# Altium integrated library Telephone.IntLib: 113 symbols (continued)
## CMP-002-00163-4 (continued)

## CMP-002-00176-3
designator P?, comment 170204-2  (mechanical)
170204-2 TE Connectivity Connector Contacts SKT Crimp ST Cable Mount 20-26AWG Loose - Arrow.com; Connector Type: Socket; Gender: Female; Insulation Resistance: 500MR; PCB Mount Retention: Without; Contact Current Rating: 2A; Number of Contacts: 6; Shielding: Unshielded; Voltage Rating (AC): 600V; Wire/Cable Gauge: 26AWG; Wire Gauge (Min): 20AWG; Pitch: 2.54mm; Insulation Diameter: 1.91mm; Plating Thickness: 0.8um; Voltage Rating: 250V; Manufacturer: TE Connectivity; Manufacturer Part Number: 170204-2; RoHS: Yes; Category: Connectors; Stock 1: 90196; Pricing 1: 1=0.12, 10=0.088, 50=0.088, 100=0.074, 1000=0.065, 10000=0.065 (USD); Mount: Cable,Through Hole; Contact Material: Bronze; Contact Plating: Tin; Housing Color: White; Housing Material: Nylon; Min Operating Temperature: -20°C; Max Operating Temperature: 105°C; Series: EI; Packaging: Loose Piece; Termination: Crimp; Contact Gender: Female; Orientation: Straight; Contact Type: Signal; Number of Rows: 1; Length: 11.1mm; Height: 10.79mm; Wire Gauge (Max): 26AWG; Depth: 2.36mm; RoHS Compliant: Yes; Reach SVHC Compliant: No; Lead Free: Lead Free; ELV: Compliant; ComponentLink1URL: https://datasheet.ciiva.com/16313/170204-2-16313345.pdf?src-supplier=Future+Electronics; ComponentLink1Description: https://datasheet.ciiva.com/16313/170204-2-16313345.pdf?src-supplier=Future+Electronics; ComponentLink2URL: https://datasheet.ciiva.com/19462/1962957-19462033.pdf?src-supplier=Jameco; ComponentLink2Description: https://datasheet.ciiva.com/19462/1962957-19462033.pdf?src-supplier=Jameco; ComponentLink3URL: https://datasheet.ciiva.com/22685/1688153-22685777.pdf?src-supplier=Element14; ComponentLink3Description: https://datasheet.ciiva.com/22685/1688153-22685777.pdf?src-supplier=Element14; ComponentLink4URL: https://datasheet.ciiva.com/18487/jpn-ss-114-5035-h-18487847.pdf?src-supplier=Digi-Key; ComponentLink4Description: https://datasheet.ciiva.com/18487/jpn-ss-114-5035-h-18487847.pdf?src-supplier=Digi-Key; ComponentLink5URL: https://datasheet.ciiva.com/15175/getdatasheetpartid-32247-15175269.pdf?src-supplier=Verical; ComponentLink5Description: https://datasheet.ciiva.com/15175/getdatasheetpartid-32247-15175269.pdf?src-supplier=Verical; ComponentLink6URL: https://datasheet.ciiva.com/11723/0900766b80d9a1b2-11723424.pdf?src-supplier=Rs; ComponentLink6Description: https://datasheet.ciiva.com/11723/0900766b80d9a1b2-11723424.pdf?src-supplier=Rs; ComponentLink7URL: https://datasheet.ciiva.com/30100/basics0-171822-2-0-30100471.pdf?src-supplier=Onlinecomponents.com; ComponentLink7Description: https://datasheet.ciiva.com/30100/basics0-171822-2-0-30100471.pdf?src-supplier=Onlinecomponents.com; ComponentLink8URL: https://datasheet.ciiva.com/16934/70085978-16934021.pdf?src-supplier=Allied+Electronics; ComponentLink8Description: https://datasheet.ciiva.com/16934/70085978-16934021.pdf?src-supplier=Allied+Electronics; ComponentLink9URL: https://datasheet.ciiva.com/696/jpn-ss-114-5035-h-696652.pdf?src-supplier=Digi-Key; ComponentLink9Description: https://datasheet.ciiva.com/696/jpn-ss-114-5035-h-696652.pdf?src-supplier=Digi-Key; Case/Package: 1000; Pins: 0; Design Item ID: 170204-2; Component Type: Mechanical; Source: V4-TEL.SCHLIB; Mounting Technology: Cable,Through Hole; Max Voltage Rating (AC): 250V; Package Quantity: 1000; Component Type: Connectors

## CMP-002-00177-2
designator P?, comment 66200421122  (value not drawn)
WR-MPC3 Series; 3mm Pitch 4 Way 2 Row Shrouded Straight PCB Header; Through Hole; Manufacturer: Wurth Electronics; Current Rating: 5A; Voltage Rating: 250V; Number of Positions: 4; Insulation: Insulated; Insulation Resistance: 1GR; Gender: Receptacle; Row Spacing: 0.118inch; Manufacturer Part Number: 66200421122; Category: Headers and Wire Housings; Mounting Technology: Through Hole; Color: Black; Contact Material: Copper Alloy,Copper; Contact Plating: Tin; Housing Material: Nylon; Contact Shape: Square; Contact Finish - Mating: TIN; Insulation Material: Polymer; Insulation Color: Black; Min Operating Temperature: -25°C; Max Operating Temperature: 105°C; Number of Rows: 2; Fastening Type: Ramp; Packaging: Tray; Contact Gender: Male; Termination: Through Hole; Number of Contacts: 4; Connector Type: Header; Series: WR-MPC3; Contact Type: Male Pin; Length: 9.7mm; Width: 9.7mm; Height: 9.9mm; Pitch: 3mm; Flammability Rating: UL94 V-0; RoHS Compliant: Yes; Reach SVHC Compliant: Unknown; ComponentLink1URL: https://datasheet.ciiva.com/8043/624425-8043413.pdf?src-supplier=Element14; ComponentLink1Description: https://datasheet.ciiva.com/8043/624425-8043413.pdf?src-supplier=Element14; ComponentLink2URL: https://datasheet.ciiva.com/731/6620xx21122-731329.pdf?src-supplier=Digi-Key; ComponentLink2Description: https://datasheet.ciiva.com/731/6620xx21122-731329.pdf?src-supplier=Digi-Key; Case/Package: 63; Pins: 4; Design Item ID: 66200421122; Component Type: Standard; Component Type: Connectors
footprint power-4pin
pins: 1, 2, 3, 4

## CMP-002-00178-2
designator P?, comment 66201021122  (value not drawn)
WR-MPC3; 3mm Pitch 10 Way 2 Row Shrouded Straight PCB Header; Through Hole; Manufacturer: Wurth Electronics; Current Rating: 5A; Voltage Rating: 250V; Number of Positions: 10; Insulation: Insulated; Insulation Resistance: 1GR; Gender: Receptacle; Manufacturer Part Number: 66201021122; Category: Headers and Wire Housings; Mounting Technology: Through Hole; Color: Black; Contact Material: Copper Alloy,Copper; Contact Plating: Tin; Housing Material: Nylon; Contact Shape: Square; Contact Finish - Mating: TIN; Insulation Material: Polymer; Insulation Color: Black; Min Operating Temperature: -25°C; Max Operating Temperature: 105°C; Number of Rows: 2; Fastening Type: Ramp; Packaging: Tray; Contact Gender: Male; Termination: Through Hole; Number of Contacts: 10; Connector Type: Header; Series: WR-MPC3; Contact Type: Male Pin; Length: 18.7mm; Width: 18.7mm; Height: 9.9mm; Pitch: 3mm; Flammability Rating: UL94 V-0; RoHS Compliant: Yes; Reach SVHC Compliant: Unknown; ComponentLink1URL: https://datasheet.ciiva.com/8043/624425-8043421.pdf?src-supplier=Element14; ComponentLink1Description: https://datasheet.ciiva.com/8043/624425-8043421.pdf?src-supplier=Element14; ComponentLink2URL: https://datasheet.ciiva.com/731/6620xx21122-731332.pdf?src-supplier=Digi-Key; ComponentLink2Description: https://datasheet.ciiva.com/731/6620xx21122-731332.pdf?src-supplier=Digi-Key; Pins: 10; Component Type: Standard; Component Type: Connectors
footprint POWER 10 PIN
pins: 1, 2, 3, 4, 5, 6, 7, 8, 9, 10

## CMP-002-00180-2
designator J?, comment 5-146274-3  (value not drawn)
Conn Unshrouded Header HDR 3 POS 2.54mm Solder ST Top Entry Thru-Hole Carton; Manufacturer: TE Connectivity; Centerline_Pitch: 2.54 mm[.1 in]; Product_Type: Connector; Connector Type: Plug,Header,Pin; Gender: Male; Voltage Rating: 750V; Approvals: CSA; Board Standoff: Yes (With); Contact Current Rating: 3A; Contact Post Length: 0.125inch; Contact Protection: No (Without); High Speed Serial Data Connector: No; High Temperature Housing: Yes; Max Voltage Rating (AC): 250V; Number of Contacts: 3; PCB Mount Retention: Without; PCB Mounting Orientation: Vertical; PCB Thickness: 0.062inch; Case/Package: None; Pins: 3; Design Item ID: 5-146274-3; EU_RoHS_Compliance: Compliant; Manufacturer Part Number: 5-146274-3; Price: None; SnapEDA_Link: https://www.snapeda.com/parts/5-146274-3/TE%20Connectivity%20AMP%20Connectors/view-part/904860/?ref=snap; Source: SnapEDAsch.SchLib; TE_purchase_URL: https://www.te.com/usa-en/product-5-146274-3.html?te_bu=Cor&te_type=disp&te_campaign=seda_glo_cor-seda-global-disp-prtnr-fy19-seda-model-bom-cta_sma-317_1&elqCampaignId=32493; Value: *; Max Operating Temperature: 105°C; Min Operating Temperature: -65°C; Mounting Technology: Through Hole; RoHS Compliant: Yes; Color: Black; Contact Finish - Mating: TIN; Contact Gender: Male; Contact Material: Bronze; Contact Mating Length: 8.08mm; Contact Plating: Tin; Contact Shape: Square; Contact Type: Male Pin; Current Rating: 3A; Depth: 2.34mm; ELV: Compliant; Fastening Type: Pull; Flammability Rating: UL94 V-0; Gasket: No (Without); Housing Color: Black; Housing Material: Polymer; Insulation Color: Black; Insulation Material: Polymer; Keyed: No; Lead Free: Lead Free; Length: 7.21mm; Mating Alignment: No (Without); Mating Connector Lock: No (Without); Number of Positions: 3; Number of Rows: 1; Orientation: Straight; Package Quantity: 540; Packaging: Carton; Pitch: 2.54mm; Radiation Hardening: No; Reach SVHC Compliant: Unknown; Row Spacing: 2.54mm; Selectively Loaded: No (Without); Series: AMPMODU MOD II; Stabilizers: No (Without); Strain Relief: No (Without); Termination: Through Hole; Component Type: Connectors
footprint TE_5-146274-3
pins: 1, 2, 3

## CMP-002-00181-1
designator J?, comment 5-146274-2
Conn Unshrouded Header HDR 2 POS 2.54mm Solder ST Top Entry Thru-Hole Carton; Manufacturer: TE Connectivity; Connector Type: Plug,Header,Pin; Gender: Male; Voltage Rating: 750V; Approvals: CSA; Board Standoff: Yes (With); Contact Current Rating: 3A; Contact Post Length: 0.125inch; Contact Protection: No (Without); High Speed Serial Data Connector: No; High Temperature Housing: Yes; Max Voltage Rating (AC): 250V; Number of Contacts: 2; PCB Mount Retention: Without; PCB Mounting Orientation: Vertical; PCB Thickness: 0.062inch; Max Operating Temperature: 105°C; Min Operating Temperature: -65°C; Mounting Technology: Through Hole; RoHS Compliant: Yes; Color: Black; Contact Finish - Mating: TIN; Contact Gender: Male; Contact Material: Bronze; Contact Mating Length: 8.08mm; Contact Plating: Tin; Contact Shape: Square; Contact Type: Male Pin; Current Rating: 3A; Depth: 2.34mm; ELV: Compliant; Fastening Type: Pull; Flammability Rating: UL94 V-0; Gasket: No (Without); Housing Color: Black; Housing Material: Polymer; Insulation Color: Black; Insulation Material: Polymer; Keyed: No; Lead Free: Lead Free; Length: 2.67mm; Mating Alignment: No (Without); Mating Connector Lock: No (Without); Number of Positions: 2; Number of Rows: 1; Orientation: Straight; Package Quantity: 500; Packaging: Carton; Pitch: 2.54mm; Radiation Hardening: No; Reach SVHC Compliant: Unknown; Row Spacing: 2.54mm; Selectively Loaded: No (Without); Series: AMPMODU MOD II; Stabilizers: No (Without); Strain Relief: No (Without); Termination: Through Hole; Manufacturer Part Number: 5-146274-2; Component Type: Connectors
footprint TE_5-146274-2
pins: 1, 2

## CMP-002-00182-1
designator J?, comment 146443-5  (value not drawn)
Conn Unshrouded Header HDR 10 POS 2.54mm Solder ST Thru-Hole Carton; Manufacturer: TE Connectivity AMP; Connector Type: Plug,Header,Pin; Board Standoff: No (Without); High Speed Serial Data Connector: No; Number of Contacts: 10; PCB Mount Retention: Without; PCB Mounting Orientation: Vertical; Plating Thickness: 5um; Mounting Technology: Surface Mount; RoHS Compliant: No; Contact Finish - Mating: GOLD; Contact Material: Copper Alloy; Contact Mating Length: 0.23inch; Contact Plating: Gold; Contact Protection: No (Without); Contact Shape: Square; Contact Type: Male Pin; ELV: Non-Compliant; Fastening Type: Pull; Gasket: No (Without); High Temperature Compatible: No; High Temperature Housing: No; Housing Color: Black; Housing Material: Thermoplastic; Keyed: No; Mating Alignment: No (Without); Mating Connector Lock: No (Without); Number of Positions: 10; Number of Rows: 2; Orientation: Vertical; Package Quantity: 320; Packaging: Carton; Pitch: 2.54mm; Radiation Hardening: No; Row Spacing: 2.54mm; Sealable: No (Without); Selectively Loaded: No (Without); Series: AMPMODU MOD II; Stabilizers: No (Without); Strain Relief: No (Without); Termination: SMD/SMT; Manufacturer Part Number: 146443-5; Component Type: Connectors
footprint 146443-5
pins: 1, 2, 3, 4, 5, 6, 7, 8, 9, 10

## CMP-002-00183-1
designator J?, comment 2-826936-0
Conn Unshrouded Header HDR 20 POS 2.54mm Solder ST Thru-Hole Box; Manufacturer: TE Connectivity; Connector Type: Plug,Header,Pin; Board Standoff: No (Without); Contact Current Rating: 5A; Contact Post Length: 0.1259inch; High Speed Serial Data Connector: No; Number of Contacts: 20; PCB Mount Retention: Without; PCB Mounting Orientation: Vertical; Plating Thickness: 2um; Max Operating Temperature: 105°C; Min Operating Temperature: -65°C; Mounting Technology: Through Hole; RoHS Compliant: Yes; Color: Green; Contact Gender: Male; Contact Material: Bronze; Contact Mating Length: 5.8mm; Contact Plating: Tin; Contact Protection: No (Without); Contact Shape: Square; Contact Type: Male Pin; ELV: Compliant; Flammability Rating: UL94 V-0; Gasket: No (Without); High Temperature Housing: No; Housing Color: Green; Housing Material: PBT; Keyed: No; Mating Alignment: No (Without); Mating Connector Lock: No (Without); Number of Positions: 20; Number of Rows: 1; Package Quantity: 300; Packaging: Box; Pitch: 2.54mm; Radiation Hardening: No; Row Spacing: 2.54mm; Selectively Loaded: No (Without); Series: AMPMODU MOD II; Stabilizers: No (Without); Strain Relief: No (Without); Termination: Through Hole; Manufacturer Part Number: 2-826936-0; Component Type: Connectors
footprint 2-826936-0
pins: 1, 2, 3, 4, 5, 6, 7, 8, 9, 10, 11, 12, 13, 14, 15, 16, 17, 18, 19, 20

## CMP-002-00184-1
designator J?, comment 1-826629-1
Conn Unshrouded Header HDR 11 POS 2.54mm Solder ST Thru-Hole Carton; Manufacturer: TE Connectivity AMP; Connector Type: Plug,Header,Pin; Board Standoff: No (Without); Contact Post Length: 0.1259inch; High Speed Serial Data Connector: No; Number of Contacts: 11; PCB Mount Retention: Without; PCB Mounting Orientation: Vertical; Plating Thickness: 0.8um; Max Operating Temperature: 105°C; Min Operating Temperature: -65°C; Mounting Technology: Straddle Mount; RoHS Compliant: Yes; Contact Finish - Mating: GOLD; Contact Gender: Male; Contact Material: Bronze; Contact Mating Length: 6.7mm; Contact Plating: Gold,Tin; Contact Protection: No (Without); Contact Shape: Square; Contact Type: Male Pin; ELV: Compliant; Fastening Type: Pull; Flammability Rating: UL94 V-0; Gasket: No (Without); High Temperature Housing: No; Housing Color: Green; Housing Material: PBT; Insulation Color: Green; Insulation Material: PBT; Keyed: No; Mating Alignment: No (Without); Mating Connector Lock: No (Without); Number of Positions: 11; Number of Rows: 1; Orientation: Straight; Package Quantity: 500; Packaging: Carton; Pitch: 2.54mm; Radiation Hardening: No; Row Spacing: 2.54mm; Selectively Loaded: No (Without); Series: AMPMODU MOD II; Stabilizers: No (Without); Strain Relief: No (Without); Termination: Through Hole; Manufacturer Part Number: 1-826629-1; Component Type: Connectors
footprint 1-826629-1
pins: 1, 2, 3, 4, 5, 6, 7, 8, 9, 10, 11

## CMP-002-00185-1
designator J?, comment 5-146274-4
5-146274-4 ; ROHS ; TYCO ; AMPMODU Breakaway Heade rs 4P HEADER TIN single r ow; Manufacturer: TE Connectivity; Connector Type: Plug,Header,Pin; Approvals: CSA; Board Standoff: Yes (With); Contact Current Rating: 3A; Contact Post Length: 0.125inch; Contact Protection: No (Without); High Speed Serial Data Connector: No; High Temperature Housing: Yes; Max Voltage Rating (AC): 250V; Number of Contacts: 4; PCB Mount Retention: Without; PCB Mounting Orientation: Vertical; PCB Thickness: 0.062inch; Pitch: 2.54mm; Max Operating Temperature: 105°C; Min Operating Temperature: -65°C; Mounting Technology: Through Hole; RoHS Compliant: Yes; Color: Black; Contact Finish - Mating: TIN; Contact Gender: Male; Contact Material: Bronze; Contact Mating Length: 8.08mm; Contact Plating: Tin; Contact Shape: Square; Contact Type: Male Pin; Depth: 2.34mm; ELV: Compliant; Fastening Type: Pull; Flammability Rating: UL94 V-0; Gasket: No (Without); Housing Color: Black; Housing Material: Polymer; Insulation Color: Black; Insulation Material: Polymer; Keyed: No; Length: 9.75mm; Mating Alignment: No (Without); Mating Connector Lock: No (Without); Number of Positions: 4; Number of Rows: 1; Orientation: Straight; Package Quantity: 500; Packaging: Carton; Radiation Hardening: No; Row Spacing: 2.54mm; Selectively Loaded: No (Without); Series: AMPMODU MOD II; Stabilizers: No (Without); Strain Relief: No (Without); Termination: Through Hole; Manufacturer Part Number: 5-146274-4; Component Type: Connectors
footprint 5-146274-3
pins: 1, 2, 3, 4

## CMP-003-00038-1
designator X?  Frequency: 3.5795MHz  (hidden comment: CMP-003-00038-1)
Crystal 3.579545MHz ±30ppm (Tol) ±50ppm (Stability) 18pF FUND 180Ohm 2-Pin HC-49/US SMD T/R; Manufacturer: Abracon; Manufacturer Part Number: ABLS-3.579545MHZ-B4-T; ESR (Equivalent Series Resistance): 180; RoHS: Yes; Category: Crystals; Stock: 4835; Pricing: 1=0.17, 10=0.138, 50=0.138, 100=0.138, 1000=0.132, 10000=0.108 (USD); Mounting Technology: Surface Mount; Case/Package: SMD/SMT; Min Operating Temperature: -20°C; Max Operating Temperature: 70°C; Packaging: Tape and Reel; Frequency Tolerance: 30ppm; Load Capacitance: 18pF; Package Quantity: 1000; Tolerance: 30ppm; Frequency Stability: 50ppm; Termination: SMD/SMT; ESR: 180; Series: ABLS; Length: 11.4mm; Width: 4.7mm; Height: 4.2mm; Depth: 4.7mm; Radiation Hardening: No; Lead Free: Lead Free; ComponentLink1URL: https://datasheet.ciiva.com/15116/getdatasheetpartid-719920-15116797.pdf?src-supplier=Verical; ComponentLink1Description: https://datasheet.ciiva.com/15116/getdatasheetpartid-719920-15116797.pdf?src-supplier=Verical; ComponentLink2URL: https://datasheet.ciiva.com/854/abls-854168.pdf?src-supplier=Digi-Key; ComponentLink2Description: https://datasheet.ciiva.com/854/abls-854168.pdf?src-supplier=Digi-Key; ComponentLink3URL: https://datasheet.ciiva.com/854/abls-854169.pdf?src-supplier=Digi-Key; ComponentLink3Description: https://datasheet.ciiva.com/854/abls-854169.pdf?src-supplier=Digi-Key; ComponentLink4URL: https://datasheet.ciiva.com/854/abls-854170.pdf?src-supplier=Digi-Key; ComponentLink4Description: https://datasheet.ciiva.com/854/abls-854170.pdf?src-supplier=Digi-Key; ComponentLink5URL: https://datasheet.ciiva.com/4944/abls-44621-4944684.pdf?src-supplier=Mouser; ComponentLink5Description: https://datasheet.ciiva.com/4944/abls-44621-4944684.pdf?src-supplier=Mouser; Pins: 2; Design Item ID: ABLS-3.579545MHZ-B4-T; Component Type: Standard; Source: V4-TEL.SCHLIB; Component Type: Crystals & Oscillators
footprint XTAL
pins: 1, 2

## CMP-004-00042-3
designator D?, comment 1N4148W_R1_00001  (value not drawn)
Si-diode 0, 15A 100V SOD123; Manufacturer: Pan Jit; Reverse Recovery Time: 4ns; Forward Current: 150mA; Peak Non-Repetitive Surge Current: 4A; Element Configuration: Single; Manufacturer Part Number: 1N4148W_R1_00001; Category: Rectifier Diodes; Pricing 1: 1=0.14000, 10=0.13000, 50=0.13000, 100=0.07100, 500=0.04400, 1000=0.03000, 3000=0.02200, 9000=0.01900, 10000=0.01900, 24000=0.01700, 45000=0.01400 (USD); Mount: Surface Mount; Min Operating Temperature: -50°C; Max Operating Temperature: 150°C; Max Repetitive Reverse Voltage (Vrrm): 100V; RoHS Compliant: Yes; ComponentLink1URL: https://datasheet.ciiva.com/8300/1n4148w-8300232.pdf?src-supplier=Avnet; ComponentLink1Description: https://datasheet.ciiva.com/8300/1n4148w-8300232.pdf?src-supplier=Avnet; Design Item ID: 1N4148W_R1_00001; Radiation Hardening: No; Mounting Technology: Surface Mount; Pins: 2; Component Type: Diodes
footprint SOD-123
pins: 1 K, 2 A

## CMP-004-00053-1
designator D?  value SMBJ5.0CA, Bi-Dir  (hidden comment: CMP-004-00053-1)
Diode TVS Single Bi-Dir 5V 600W 2-Pin SMBJ; Manufacturer: Bourns; Manufacturer Part Number: SMBJ5.0CA; Min Breakdown Voltage: 6.4V; Max Surge Current: 100A; Breakdown Voltage: 7.25V; Polarity: Bidirectional; Peak Pulse Current: 65.2A; Number of Bidirectional Channels: 1; Power Line Protection: No; Diode Type: ZENER; Operating Supply Voltage: 3.5V; Max Reverse Leakage Current: 1.6mA; Test Current: 10mA; Clamping Voltage: 9.2V; RoHS: Yes; Category: TVS Diodes; Case/Package: DO-214AA; Pins: 2; Min Operating Temperature: -55°C; Max Operating Temperature: 150°C; Packaging: Tape and Reel; Reverse Standoff Voltage: 5V; Peak Pulse Power: 600W; Package Quantity: 1; Termination: SMD/SMT; Max Power Dissipation: 600W; Series: SMBJ; Direction: Bidirectional; Number of Channels: 1; Max Breakdown Voltage: 7.25V; Radiation Hardening: No; RoHS Compliant: Yes; ComponentLink1URL: https://datasheet.ciiva.com/334/smbj-334706.pdf?src-supplier=Digi-Key; ComponentLink1Description: https://datasheet.ciiva.com/334/smbj-334706.pdf?src-supplier=Digi-Key; ComponentLink2URL: https://datasheet.ciiva.com/3022/smbj-3022578.pdf?src-supplier=Avnet; ComponentLink2Description: https://datasheet.ciiva.com/3022/smbj-3022578.pdf?src-supplier=Avnet; ComponentLink3URL: https://datasheet.ciiva.com/334/smbj-334707.pdf?src-supplier=Digi-Key; ComponentLink3Description: https://datasheet.ciiva.com/334/smbj-334707.pdf?src-supplier=Digi-Key; ComponentLink4URL: https://datasheet.ciiva.com/334/smbj-334708.pdf?src-supplier=Digi-Key; ComponentLink4Description: https://datasheet.ciiva.com/334/smbj-334708.pdf?src-supplier=Digi-Key; ComponentLink5URL: https://datasheet.ciiva.com/28410/1677318-28410120.pdf?src-supplier=Element14; ComponentLink5Description: https://datasheet.ciiva.com/28410/1677318-28410120.pdf?src-supplier=Element14; ComponentLink6URL: https://datasheet.ciiva.com/8031/1677318-8031161.pdf?src-supplier=Element14; ComponentLink6Description: https://datasheet.ciiva.com/8031/1677318-8031161.pdf?src-supplier=Element14; ComponentLink7URL: https://datasheet.ciiva.com/30104/smbj-30104446.pdf?src-supplier=Onlinecomponents.com; ComponentLink7Description: https://datasheet.ciiva.com/30104/smbj-30104446.pdf?src-supplier=Onlinecomponents.com; Design Item ID: SMBJ5.0CA; Component Type: Standard; Element Configuration: Single; Leakage Current: 1.6mA; Mount: Surface Mount; Number of Elements: 1; Pin Count: 2; Pricing 1: 1=0.51000, 10=0.38300, 50=0.38300, 100=0.23900, 1000=0.13000, 10000=0.12600 (USD); REACH SVHC: No SVHC; Resistor Type: Zener; Reverse Breakdown Voltage: 6.4V; Source: PTZ.SCHLIB; Stock 1: 248; Component Type: Diodes
footprint SMB (DO-214AA)
pins: 1, 2

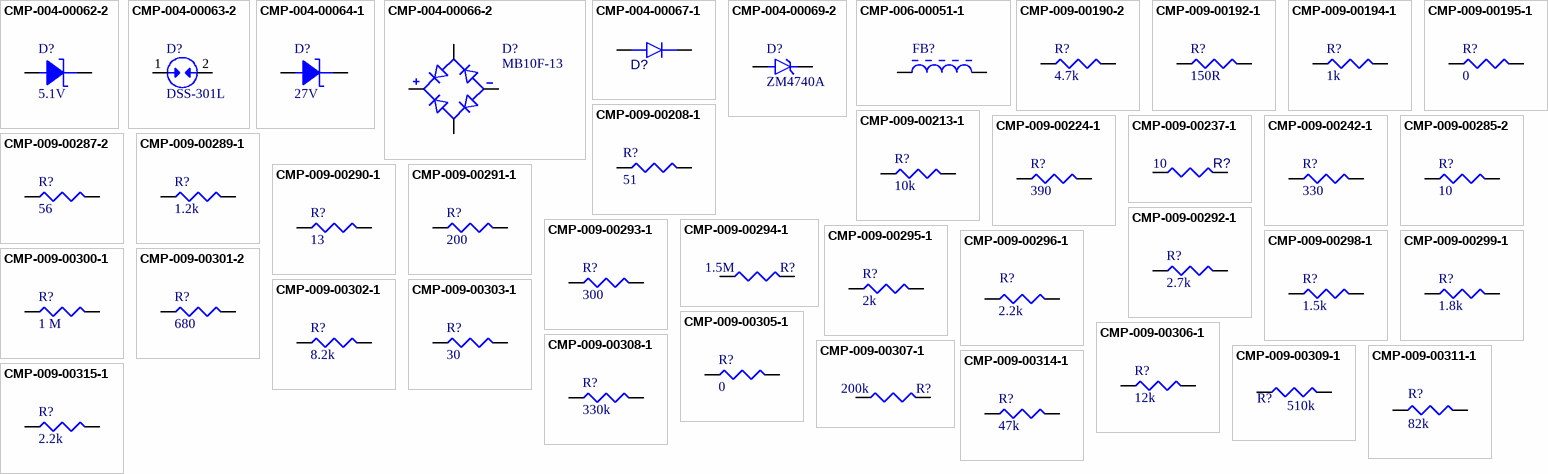
[diagram p1: symbols CMP-004-00062-2 to CMP-009-00315-1]

## CMP-004-00062-2
designator D?, comment value 5.1V  (hidden comment: DDZ5V1BS-7)
Diode Zener Single 5.1V 2.564% 200mW Automotive 2-Pin SOD-323 T/R; Manufacturer: Diodes; Tolerance: 3%; Impedance: 17R; Max Reverse Leakage Current: 5uA; Test Current: 20mA; Forward Voltage: 900mV; Manufacturer Part Number: DDZ5V1BS-7; RoHS: Yes; Category: Zener Diodes; Pricing 1: 1=0.12, 10=0.101, 50=0.101, 100=0.07, 1000=0.055, 10000=0.033 (USD); Mount: Surface Mount; Case/Package: SOD-323-2; Weight: 0.000173oz; Min Operating Temperature: -65°C; Max Operating Temperature: 150°C; Package Quantity: 3000; Packaging: Tape and Reel; Max Power Dissipation: 200mW; Zener Voltage: 5.1V; Voltage Tolerance: 2.564%; Power Dissipation: 200mW; Zener Current: 5uA; Max Reverse Current: 5uA; Power Rating: 200mW; Length: 2.5mm; Width: 1.3mm; Height: 1.05mm; Radiation Hardening: No; RoHS Compliant: Yes; Pins: 2; Component Type: Standard; Pin Count: 2; Mounting Technology: Surface Mount; Component Type: Diodes
footprint Zener 5.1V
pins: 1, 2

## CMP-004-00063-2
designator D?, comment DSS-301L
MITSUBISHI MATERIALS DSS Series 300V 0.5kA Through Hole Surge Absorber Gas Discharge Tube (GDT); Manufacturer: Mitsubishi; Manufacturer Part Number: DSS-301L; Mount: Through Hole; Length: 7mm; Height: 3.3mm; Design Item ID: DSS-301L; Component Type: Standard; Pins: 2; RoHS Compliant: No; Component Type: Diodes
footprint DSS
pins: 1, 2

## CMP-004-00064-1
designator D?  value 27V  (hidden comment: CMP-004-00064-1)
On a Reel of 3000, ON Semiconductor, 27V Zener Diode 2% 300 mW SMT 2-Pin SOD-323, RL; Manufacturer Part Number: MM3Z27VST1G; Max Power Dissipation: 200mW; Max Reverse Leakage Current: 50nA; Impedance: 80R; Zener Voltage: 26.86V; Test Current: 5mA; Manufacturer: ON Semiconductor; RoHS: Yes; Category: Zener Diodes; Stock 1: 26808; Pricing 1: 1=0.15, 10=0.126, 50=0.126, 100=0.075, 1000=0.032, 10000=0.02 (USD); Case/Package: SOD-323-2; Min Operating Temperature: -65°C; Max Operating Temperature: 150°C; Package Quantity: 3000; Packaging: Tape and Reel; Power Dissipation: 200mW; Voltage Tolerance: 2%; Length: 1.8mm; Width: 1.35mm; Height: 1mm; Radiation Hardening: No; Lead Free: Lead Free; RoHS Compliant: Yes; ComponentLink1URL: https://datasheet.ciiva.com/10637/mm3z2v4st1-d-10637814.pdf?src-supplier=Avnet; ComponentLink1Description: https://datasheet.ciiva.com/10637/mm3z2v4st1-d-10637814.pdf?src-supplier=Avnet; Pins: 2; Design Item ID: MM3Z27VST1G; Component Type: Standard; Pin Count: 2; Source: V4-TEL.SCHLIB; Component Type: Diodes
footprint Diode - 27V
pins: 1, 2

## CMP-004-00066-2
designator D?, comment MB10F-13
Bridge Rectifier Single Phase Standard 1 kV Surface Mount MBF; Manufacturer: Diodes; Forward Current: 800mA; Forward Voltage: 940mV; Max Surge Current: 30A; Peak Inverse Voltage: 1kV; Case/Package: MBF; Pins: 4; Max Operating Temperature: 150°C; Min Operating Temperature: -55°C; Mounting Technology: Surface Mount; Manufacturer Part Number: MB10F-13; Component Type: Diodes
footprint DIOB_MB10F-13
pins: 1 POS, 2 AC1, 3 NEG, 4 AC2

## CMP-004-00067-1
designator D?, comment MURS140-E3/5BT  (value not drawn)
MURS140 Series 400 V 1 A 75 ns SMT Ultrafast Plastic Rectifier - DO-214AA; Manufacturer: Vishay Semiconductors; Forward Current: 2A; Forward Voltage: 1.25V; Max Surge Current: 35A; Peak Inverse Voltage: 400V; Max Reverse Current: 5uA; Recovery Time: 75ns; Case/Package: SMB; Max Operating Temperature: 175°C; Min Operating Temperature: -65°C; Mounting Technology: Surface Mount; Pins: 2; RoHS Compliant: Yes; Average Rectified Current: 2A; Lead Free: Lead Free; Max Repetitive Reverse Voltage (Vrrm): 400V; Max Reverse Voltage (DC): 400V; Package Quantity: 3200; Packaging: Tape and Reel; Peak Non-Repetitive Surge Current: 35A; Radiation Hardening: No; Reverse Recovery Time: 75ns; Reverse Recovery Time-Max: 75ns; Reverse Voltage: 400V; Manufacturer Part Number: MURS140-E3/5BT; Component Type: Diodes
footprint DO-214AA-2
pins: 1 K, 2 A

## CMP-004-00069-2
designator D?, comment ZM4740A
Zener Diodes 10 Volt 1 Watt 5%; Manufacturer Part Number: ZM4740A_L0G; Manufacturer: Taiwan Semiconductor; Impedance: 7R; Max Power Dissipation: 1W; Max Reverse Leakage Current: 10uA; Zener Voltage: 10V; Case/Package: MELF; Pins: 2; Max Operating Temperature: 175°C; Min Operating Temperature: -65°C; RoHS Compliant: Yes; Package Quantity: 5000; Packaging: Tape and Reel; Voltage Tolerance: 5%; Manufacturer Part Number: ZM4740A; Component Type: Diodes
footprint DIOMELF5124N
pins: A, C K

## CMP-006-00051-1
designator FB?  (value not drawn)
Ferrite Beads 0603 60ohm; Manufacturer 1: Murata; Manufacturer Part Number 1: BLM18PG471SN1B; Manufacturer Part Number: BLM18PG471SN1D; Tolerance: 25%; Impedance: 470R; DC Resistance (DCR): 200mR; Current Rating: 1A; RoHS: Yes; Category: Ferrite Beads and Chips; Case/Package: 0603; Min Operating Temperature: -55°C; Max Operating Temperature: 125°C; Package Quantity: 1000; Packaging: Bulk; ComponentLink1URL: http://www.mouser.com/ds/2/281/c31e-794748.pdf?src-supplier=Mouser; ComponentLink1Description: http://www.mouser.com/ds/2/281/c31e-794748.pdf?src-supplier=Mouser; Pins: 2; Design Item ID: BLM18PG471SN1B; Source: PTZLib.SchLib; Manufacturer: Murata; Component Type: Inductors
footprint R0603
pins: 1, 2

## CMP-009-00190-2
designator R?, comment value 4.7k  (hidden comment: KTR03EZPJ472)
RES SMD 4.7K OHM 5% 1/10W 0603; Manufacturer 1: Rohm; Max Power Dissipation: 100mW; Temperature Coefficient: 200ppm/°C; Case/Package: 0603; RoHS Compliant: Yes; Min Operating Temperature: -55°C; Max Operating Temperature: 155°C; Tolerance: 5%; Design Item ID: KTR03EZPJ472; Category: Chip SMD Resistors; Height: 0.022inch; Length: 0.063inch; Manufacturer Part Number 1: KTR03EZPJ472; Number of Terminations: 2; Package Quantity: 5000; Packaging: Tape and Reel; Pricing 1: 1=0.13000, 10=0.11500, 50=0.11500, 100=0.04400, 1000=0.02200, 10000=0.01400 (USD); Resistor Type: Thick Film; RoHS: Yes; Series: KTR03; Source: PTZLib.SchLib; Stock 1: 12843; Width: 0.031inch; ComponentLink1Description: https://datasheet.ciiva.com/14984/ktr-14984741.pdf?src-supplier=Digi-Key; ComponentLink1URL: https://datasheet.ciiva.com/14984/ktr-14984741.pdf?src-supplier=Digi-Key; Component Type: Resistors
footprint R0603
pins: 1, 2

## CMP-009-00192-1
designator R?  value 150R  (hidden comment: CMP-009-00192-1)
TE CONNECTIVITY - CRGP0603F150R - Chipwiderstand, Oberflächenmontage, 0603 [Metrisch 1608], 150 ohm, CRGP Series, 50 V, Dickschicht; RoHS: Yes; Category: Chip SMD Resistors; Stock 1: 18693; Pricing 1: 1=0.17000, 10=0.14800, 100=0.05780, 1000=0.02420, 2500=0.02218 (USD); ComponentLink1URL: https://4donline.ihs.com/images/VipMasterIC/IC/TYEL/TYEL-S-A0005460475/TYEL-S-A0005460475-1.pdf?hkey=52A5661711E402568146F3353EA87419&src-supplier=Farnell; ComponentLink1Description: https://4donline.ihs.com/images/VipMasterIC/IC/TYEL/TYEL-S-A0005460475/TYEL-S-A0005460475-1.pdf?hkey=52A5661711E402568146F3353EA87419&src-supplier=Farnell; ComponentLink2URL: https://4donline.ihs.com/images/VipMasterIC/IC/TYEL/TYEL-S-A0005460475/TYEL-S-A0005460475-1.pdf?hkey=52A5661711E402568146F3353EA87419&src-supplier=Newark; ComponentLink2Description: https://4donline.ihs.com/images/VipMasterIC/IC/TYEL/TYEL-S-A0005460475/TYEL-S-A0005460475-1.pdf?hkey=52A5661711E402568146F3353EA87419&src-supplier=Newark; RoHS Compliant: Yes; Design Item ID: CRGP0603F150R; Manufacturer 1: TE Connectivity; Manufacturer Part Number 1: CRGP0603F150R; Source: PTZLib.SchLib; Component Type: Resistors
footprint R0603
pins: 1, 2

## CMP-009-00194-1
designator R?  value 1k  (hidden comment: CMP-009-00194-1)
Res Thick Film 0603 1K Ohm 1% 1/10W ±100ppm/°C Molded SMD Paper T/R; Manufacturer: Yageo; Manufacturer Part Number: AC0603FR-071KL; Power Rating: 100mW; Voltage Rating: 50V; RoHS: Yes; Category: Chip SMD Resistors; Stock 1: 617396; Pricing 1: 1=0.10000, 10=0.02900, 50=0.02900, 100=0.01200, 1000=0.00500, 10000=0.00300 (USD); Case/Package: 0603; Case Code (Metric): 1608; Size Code: 0603; Min Operating Temperature: -55°C; Max Operating Temperature: 155°C; Tolerance: 1%; Packaging: Tape and Reel; Package Quantity: 1; Resistor Type: Thick Film; Number of Terminations: 2; Termination: SMD/SMT; Max Power Dissipation: 100mW; Temperature Coefficient: 100ppm/°C; Features: Moisture Resistant,Automotive AEC-Q200,Anti-Sulfur; Series: AC; Construction: Rectangular; Length: 0.063inch; Width: 0.031inch; Height: 0.022inch; Depth: 0.8mm; Military Standard: Not; Lead Free: Lead Free; RoHS Compliant: Yes; ComponentLink1URL: https://datasheet.ciiva.com/5558/pyu-ac-51-rohs-l-2-5558269.pdf?src-supplier=Mouser; ComponentLink1Description: https://datasheet.ciiva.com/5558/pyu-ac-51-rohs-l-2-5558269.pdf?src-supplier=Mouser; Design Item ID: AC0603FR-071KL; Source: PTZLib.SchLib; Component Type: Resistors
footprint R0603
pins: 1, 2

## CMP-009-00195-1
designator R?, comment value 0  (hidden comment: RMCF0603ZT0R00)
Res Thkflm 0603 0 Ohm Jumper 1/10W 100Ppm/ C Smd Rohs Compliant: Yes; Manufacturer 1: Stackpole Electronics; Current Rating: 1A; Max Power Dissipation: 100mW; Working Voltage: 75V; Case/Package: 0603; RoHS Compliant: Yes; Min Operating Temperature: -55°C; Max Operating Temperature: 155°C; Design Item ID: RMCF0603ZT0R00; Case Code (Metric): 1608; Category: Chip SMD Resistors; Construction: Rectangular; Contact Plating: Tin,Matte; Depth: 0.8mm; Features: Automotive AEC-Q200; Height: 0.022inch; Lead Free: Lead Free; Length: 1.55mm; Manufacturer Part Number 1: RMCF0603ZT0R00; Military Standard: Not; Mount: Surface Mount; Number of Terminations: 2; Packaging: Tape and Reel; Power Rating: 100mW; Pricing 1: 1=0.10000, 10=0.01300, 25=0.00960, 50=0.00720, 100=0.00530, 250=0.00404, 500=0.00324, 1000=0.00238 (USD); Radiation Hardening: No; Resistor Type: Thick Film; RoHS: Yes; Series: RMCF; Source: PTZLib.SchLib; Stock 1: 617251; Width: 0.031inch; ComponentLink1Description: https://www.seielect.com/catalog/SEI-Packaging.pdf?src-supplier=Digi-Key; ComponentLink1URL: https://www.seielect.com/catalog/SEI-Packaging.pdf?src-supplier=Digi-Key; ComponentLink2Description: https://www.seielect.com/Catalog/SEI-RMCF_RMCP.pdf?src-supplier=Digi-Key; ComponentLink2URL: https://www.seielect.com/Catalog/SEI-RMCF_RMCP.pdf?src-supplier=Digi-Key; ComponentLink3Description: https://www.seielect.com/catalog/SEI-Packaging.pdf?src-supplier=Arrow+Electronics; ComponentLink3URL: https://www.seielect.com/catalog/SEI-Packaging.pdf?src-supplier=Arrow+Electronics; ComponentLink4Description: https://www.seielect.com/catalog/SEI-Packaging.pdf?src-supplier=Avnet; ComponentLink4URL: https://www.seielect.com/catalog/SEI-Packaging.pdf?src-supplier=Avnet; ComponentLink5Description: https://www.seielect.com/catalog/SEI-Packaging.pdf?src-supplier=Verical; ComponentLink5URL: https://www.seielect.com/catalog/SEI-Packaging.pdf?src-supplier=Verical; Component Type: Resistors
footprint R0603
pins: 1, 2

## CMP-009-00208-1
designator R?  value 51  (hidden comment: CMP-009-00208-1)
Thick Film Resistors - SMD 0.2W 51ohm 1% 100ppm; Manufacturer 1: KOA Speer; Manufacturer Part Number 1: SG73S1JTTD51R0F; Power Rating: 200mW; Voltage Rating: 50V; Temperature Coefficient: 100ppm/°C; RoHS: Yes; Category: Chip SMD Resistors; Stock 1: 9823; Pricing 1: 1=0.20000, 10=0.13500, 50=0.13500, 100=0.05100, 1000=0.02400, 10000=0.01500 (USD); Case/Package: 0603; Case Code (Metric): 1608; Min Operating Temperature: -55°C; Max Operating Temperature: 155°C; Packaging: Tape and Reel; Package Quantity: 5000; Tolerance: 1%; Resistor Type: Thick Film; Termination: SMD/SMT; Voltage Rating (DC): 50V; Series: SG73; Length: 1.6mm; Width: 0.8mm; Height: 0.45mm; RoHS Compliant: Yes; ComponentLink1URL: http://www.koaspeer.com/catimages/Products/SG73/SG73.pdf?src-supplier=Mouser; ComponentLink1Description: http://www.koaspeer.com/catimages/Products/SG73/SG73.pdf?src-supplier=Mouser; Pins: 2; Design Item ID: SG73S1JTTD51R0F; Source: PTZLib.SchLib; Component Type: Resistors
footprint R0603
pins: 1, 2

## CMP-009-00213-1
designator R?, comment value 10k  (hidden comment: CRCW060310K0JNEA)
Res Thick Film 0603 10K Ohm 5% 1/10W 200ppm/C Molded SMD SMD Paper T/R; Manufacturer 1: Vishay Dale; Voltage Rating: 75V; Max Power Dissipation: 100mW; Temperature Coefficient: 200ppm/°C; Case/Package: 0603; Pins: 2; RoHS Compliant: Yes; Min Operating Temperature: -55°C; Max Operating Temperature: 155°C; Tolerance: 5%; Design Item ID: CRCW060310K0JNEA; Case Code (Metric): 1608; Category: Chip SMD Resistors; Construction: Rectangular; Contact Plating: Tin; Depth: 0.85mm; Features: Automotive AEC-Q200; Height: 0.02inch; Lead Free: Lead Free; Length: 1.55mm; Manufacturer Part Number 1: CRCW060310K0JNEA; Military Standard: Not; Mount: Surface Mount; Number of Terminations: 2; Package Quantity: 1; Packaging: Tape and Reel; Power Rating: 100mW; Pricing 1: 1=0.10000, 10=0.03300, 100=0.01360, 1000=0.00610, 2500=0.00529 (USD); Radiation Hardening: No; REACH SVHC: Unknown; Resistance Tolerance: 5%; Resistor Type: Thick Film; RoHS: Yes; Series: CRCW; Size Code: 0603; Source: PTZLib.SchLib; Stock 1: 41; Termination: SMD/SMT; Voltage Rating (DC): 75V; Weight: 7.1E-05oz; Width: 0.033inch; ComponentLink1Description: https://datasheet.ciiva.com/3256/dcrcwe3-3256943.pdf?src-supplier=Avnet; ComponentLink1URL: https://datasheet.ciiva.com/3256/dcrcwe3-3256943.pdf?src-supplier=Avnet; ComponentLink2Description: https://datasheet.ciiva.com/2461/dcrcwe3-2461971.pdf?src-supplier=Digi-Key; ComponentLink2URL: https://datasheet.ciiva.com/2461/dcrcwe3-2461971.pdf?src-supplier=Digi-Key; ComponentLink3Description: https://datasheet.ciiva.com/2461/dcrcwe3-2461972.pdf?src-supplier=Digi-Key; ComponentLink3URL: https://datasheet.ciiva.com/2461/dcrcwe3-2461972.pdf?src-supplier=Digi-Key; ComponentLink4Description: https://datasheet.ciiva.com/2461/dcrcwe3-2461973.pdf?src-supplier=Digi-Key; ComponentLink4URL: https://datasheet.ciiva.com/2461/dcrcwe3-2461973.pdf?src-supplier=Digi-Key; ComponentLink5Description: https://datasheet.ciiva.com/3256/dcrcwe3-3256942.pdf?src-supplier=Avnet; ComponentLink5URL: https://datasheet.ciiva.com/3256/dcrcwe3-3256942.pdf?src-supplier=Avnet; ComponentLink6Description: https://datasheet.ciiva.com/16343/dcrcwe3-16343525.pdf?src-supplier=Future+Electronics; ComponentLink6URL: https://datasheet.ciiva.com/16343/dcrcwe3-16343525.pdf?src-supplier=Future+Electronics; ComponentLink7Description: https://datasheet.ciiva.com/16755/70201119-16755717.pdf?src-supplier=Allied+Electronics; ComponentLink7URL: https://datasheet.ciiva.com/16755/70201119-16755717.pdf?src-supplier=Allied+Electronics; ComponentLink8Description: https://datasheet.ciiva.com/16515/dcrcwe3-16515020.pdf?src-supplier=Avnet+Asia; ComponentLink8URL: https://datasheet.ciiva.com/16515/dcrcwe3-16515020.pdf?src-supplier=Avnet+Asia; ComponentLink9Description: https://datasheet.ciiva.com/16771/70201119-16771051.pdf?src-supplier=Allied+Electronics; ComponentLink9URL: https://datasheet.ciiva.com/16771/70201119-16771051.pdf?src-supplier=Allied+Electronics; Component Type: Resistors
footprint R0603
pins: 1, 2

## CMP-009-00224-1
designator R?  value 390  (hidden comment: CMP-009-00224-1)
Res Thick Film 0603 390 Ohm 1% 1/10W 100ppm/C Molded SMD Paper T/R; Manufacturer 1: Yageo; Manufacturer Part Number 1: RC0603FR-13390RL; Temperature Coefficient: 100ppm/°C; Power Rating: 100mW; Voltage Rating: 50V; RoHS: Yes; Category: Chip SMD Resistors; Stock 1: 12402; Case/Package: 0603; Contact Plating: Tin,Matte; Case Code (Metric): 1608; Min Operating Temperature: -55°C; Max Operating Temperature: 155°C; Tolerance: 1%; Resistor Type: Thick Film; Packaging: Tape and Reel; Termination: SMD/SMT; Series: RC; Construction: Rectangular; Length: 1.6mm; Width: 0.8mm; Height: 0.45mm; Depth: 0.8mm; Military Standard: Not; RoHS Compliant: Yes; ComponentLink1URL: https://datasheet.ciiva.com/8885/pyu-rc0603-51-rohs-l-4-8885886.pdf?src-supplier=Avnet; ComponentLink1Description: https://datasheet.ciiva.com/8885/pyu-rc0603-51-rohs-l-4-8885886.pdf?src-supplier=Avnet; Pricing 1: 1=0.10000, 10=0.02500, 50=0.02500, 100=0.01100, 1000=0.00500, 10000=0.00400 (USD); Design Item ID: RC0603FR-13390RL; Source: PTZLib.SchLib; Component Type: Resistors
footprint R0603
pins: 1, 2

## CMP-009-00237-1
designator R?, comment value 10  (hidden comment: CRCW060310R0FKEAHP)
Res Thick Film 0603 10K Ohm 5% 1/10W 200ppm/C Molded SMD SMD Paper T/R; Manufacturer: Vishay Dale; Manufacturer Part Number: CRCW060310K0JNEA; Manufacturer: Vishay; Tolerance: 1%; Voltage Rating: 75V; Max Power Dissipation: 333mW; Power Rating: 250mW; Temperature Coefficient: 200ppm/°C; Case/Package: 0603; Pins: 2; RoHS Compliant: Yes; Min Operating Temperature: -55°C; Max Operating Temperature: 155°C; Design Item ID: CRCW060310K0JNEA; Category: Chip SMD Resistors; Construction: Rectangular; Contact Plating: Tin; Depth: 0.85mm; Features: Automotive AEC-Q200; Height: 0.02inch; Lead Free: Lead Free; Length: 1.55mm; Military Standard: Not; Mount: Surface Mount; Number of Terminations: 2; Package Quantity: 1; Packaging: Tape and Reel; Radiation Hardening: No; Resistance Tolerance: 5%; Resistor Type: Thick Film; RoHS: Yes; Series: CRCW; Size Code: 0603; Stock 1: 41; Termination: SMD/SMT; Voltage Rating (DC): 75V; Weight: 7.1E-05oz; Width: 0.033inch; ComponentLink1Description: https://datasheet.ciiva.com/3256/dcrcwe3-3256943.pdf?src-supplier=Avnet; ComponentLink1URL: https://datasheet.ciiva.com/3256/dcrcwe3-3256943.pdf?src-supplier=Avnet; ComponentLink2Description: https://datasheet.ciiva.com/2461/dcrcwe3-2461971.pdf?src-supplier=Digi-Key; ComponentLink2URL: https://datasheet.ciiva.com/2461/dcrcwe3-2461971.pdf?src-supplier=Digi-Key; ComponentLink3Description: https://datasheet.ciiva.com/2461/dcrcwe3-2461972.pdf?src-supplier=Digi-Key; ComponentLink3URL: https://datasheet.ciiva.com/2461/dcrcwe3-2461972.pdf?src-supplier=Digi-Key; ComponentLink4Description: https://datasheet.ciiva.com/2461/dcrcwe3-2461973.pdf?src-supplier=Digi-Key; ComponentLink4URL: https://datasheet.ciiva.com/2461/dcrcwe3-2461973.pdf?src-supplier=Digi-Key; ComponentLink5Description: https://datasheet.ciiva.com/3256/dcrcwe3-3256942.pdf?src-supplier=Avnet; ComponentLink5URL: https://datasheet.ciiva.com/3256/dcrcwe3-3256942.pdf?src-supplier=Avnet; ComponentLink6Description: https://datasheet.ciiva.com/16343/dcrcwe3-16343525.pdf?src-supplier=Future+Electronics; ComponentLink6URL: https://datasheet.ciiva.com/16343/dcrcwe3-16343525.pdf?src-supplier=Future+Electronics; ComponentLink7Description: https://datasheet.ciiva.com/16755/70201119-16755717.pdf?src-supplier=Allied+Electronics; ComponentLink7URL: https://datasheet.ciiva.com/16755/70201119-16755717.pdf?src-supplier=Allied+Electronics; ComponentLink8Description: https://datasheet.ciiva.com/16515/dcrcwe3-16515020.pdf?src-supplier=Avnet+Asia; ComponentLink8URL: https://datasheet.ciiva.com/16515/dcrcwe3-16515020.pdf?src-supplier=Avnet+Asia; ComponentLink9Description: https://datasheet.ciiva.com/16771/70201119-16771051.pdf?src-supplier=Allied+Electronics; ComponentLink9URL: https://datasheet.ciiva.com/16771/70201119-16771051.pdf?src-supplier=Allied+Electronics; Manufacturer Part Number: CRCW060310R0FKEAHP; Component Type: Resistors
footprint R0603
pins: 1, 2
1 alternate drawing of the same symbol
